# Altium footprint library aiskylab-01Resistors.PcbLib: 208 footprints (part 3 of 13)
Each footprint in its own frame and in the unit in brackets; x right, y up, seen from the top. Pads: shape width x height; smd on the part's side, far side on the other; paste and mask are expansions set on the pad; w line width, h text height; cw(c..) or ccw(c..) is an arc to the next point about the centre after c.
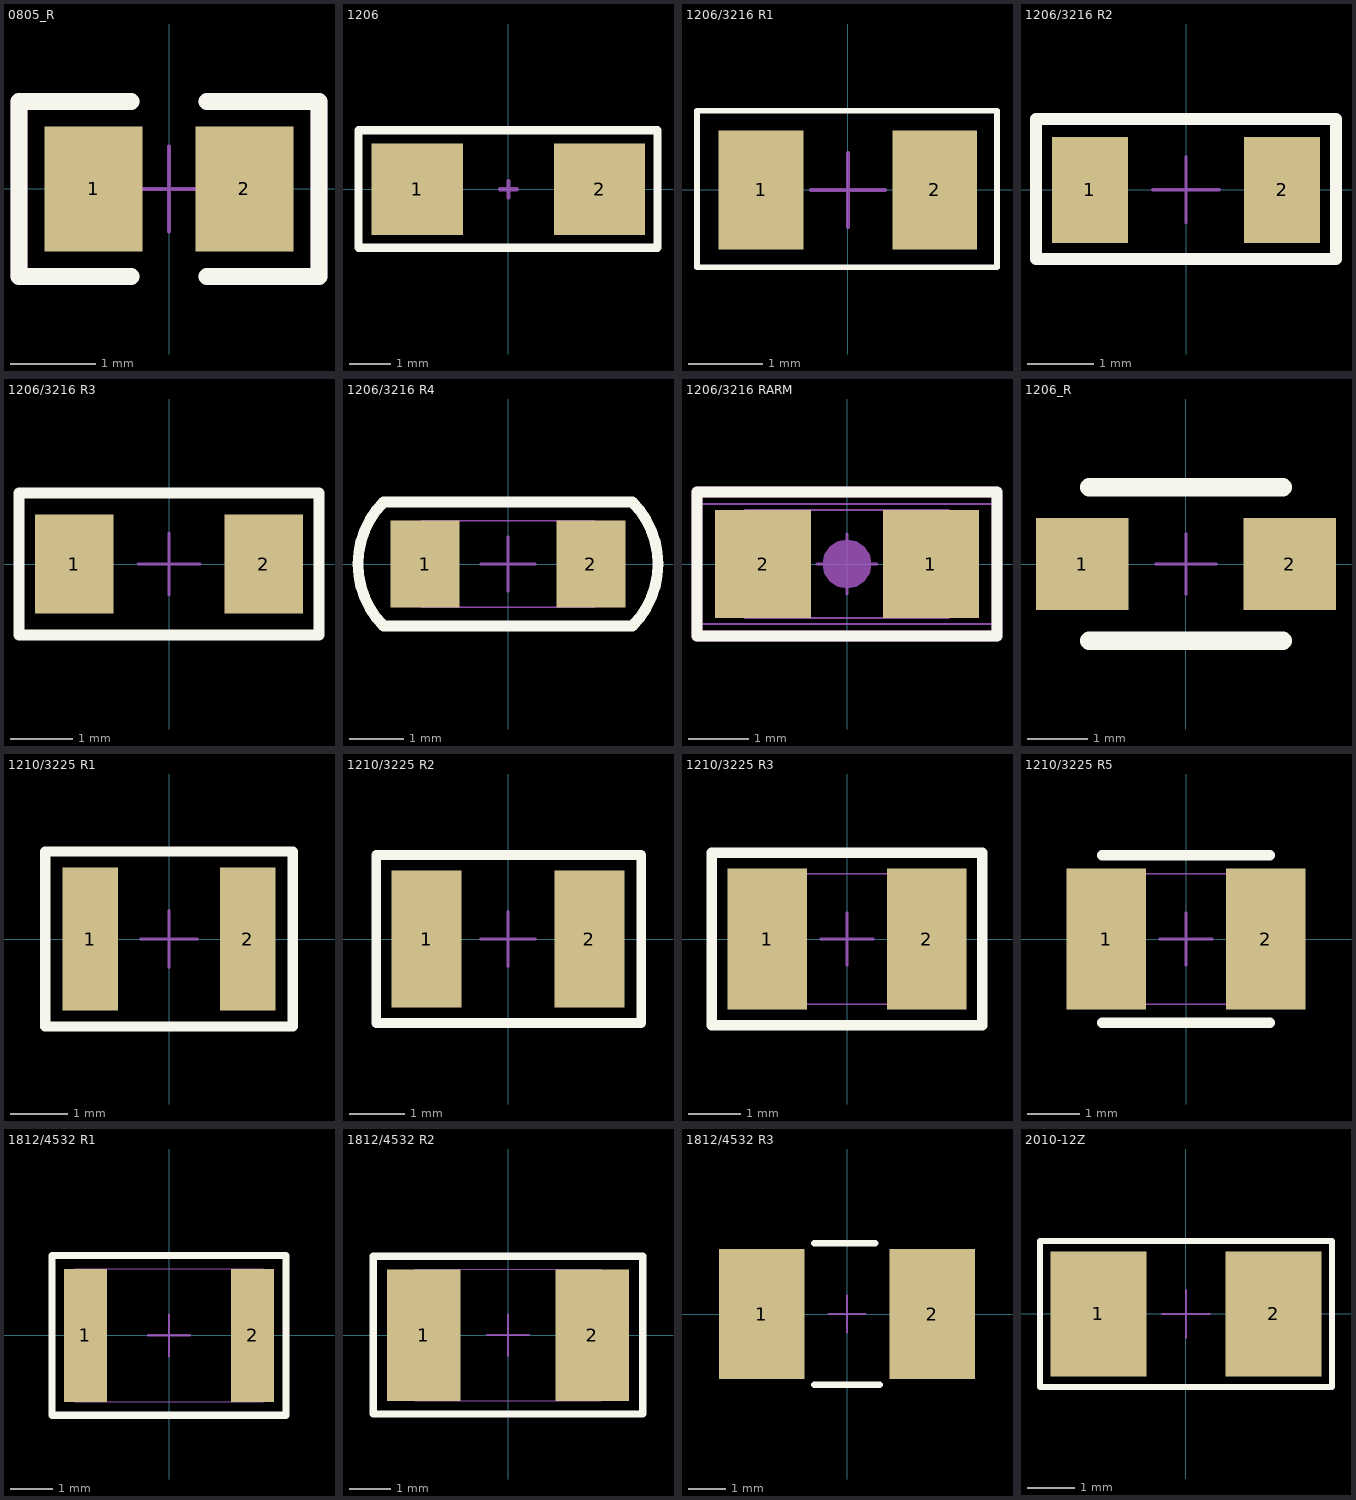
[diagram p2: the footprints below, top view; thin cyan lines are the x and y axes]

## 0805_R [mm]
pads (2):
  rect 1.16x1.47 smd: 1(-0.89,0) 2(0.89,0)
Top Overlay:
  lines w0.2: -0.45,-1.035 -1.77,-1.035 -1.77,1.035 -0.45,1.035 ; 0.45,-1.035 1.77,-1.035 1.77,1.035 0.45,1.035
Top Designator:
  text ".Designator" at -7.618,-0.508 h1.52
Top Assembly:
  lines w0.2: -0.45,-1.035 -1.77,-1.035 -1.77,1.035 -0.45,1.035 ; 0.45,-1.035 1.77,-1.035 1.77,1.035 0.45,1.035
Top Component Center:
  lines w0.05: -0.5,0 0.5,0 ; 0,-0.5 0,0.5
Top Component Outline:
  lines w0.2: -0.45,-1.035 -1.77,-1.035 -1.77,1.035 -0.45,1.035 ; 0.45,-1.035 1.77,-1.035 1.77,1.035 0.45,1.035
3D body "User Library-R_0805.STEP": height 0.49, standoff -0.01, extent -0.997,-0.625 1.003,0.625

## 1206 [mm] "1206,2-Leads, Body 6.5x2.2mm, Pitch 2.7mm"
height 4.3
pads (2):
  rect 2.2x2.2 smd: 1(-2.2,0) 2(2.2,0)
Top Overlay:
  lines w0.2: -3.62,-1.41 -3.62,1.42 3.6,1.42 3.6,-1.41 -3.62,-1.41
Top Designator:
  text ".Designator" at -7.628,-0.503 h1.52
Top Assembly:
  lines w0.1: -3.63,-1.41 -3.63,1.42 3.61,1.42 3.61,-1.41 -3.63,-1.41
Top Component Center:
  lines w0.1: -0.2,0 0.2,0 ; 0,-0.2 0,0.2
Top Component Outline:
  lines w0.1: -3.63,-1.41 -3.63,1.42 3.61,1.42 3.61,-1.41 -3.63,-1.41
3D body "WE-VS_1206_VS.stp": height 1.45, standoff -0.05, extent -1.6,-0.8 1.6,0.8

## 1206/3216 R1 [mil]
height 649.61
pads (2):
  rect 45x63 smd mask+2.76: 1(-46,0)
  rect 45x63 smd: 2(46,0)
Top Overlay:
  lines w3: -80,-41 -80,42 79,42 79,-41 -80,-41
Top Designator:
  text ".Designator" at -300.4,-19.49 h60
Top Component Center:
  lines w1.97: -19.68,0 19.68,0 ; 0,-19.68 0,19.68
3D body "1_6-1_143-1206.stp": height 0.79, standoff 0, extent -68.5,-31.49 -23.5,31.5
3D body "1206-r.stp": height 21.85, standoff 0, extent -63,-31.5 62.99,31.5
3D body "1_6-1_143-1206.stp": height 0.79, standoff 0, extent 23.5,-31.49 68.5,31.5

## 1206/3216 R2 [mil]
height 649.61
pads (2):
  rect 45x63 smd mask+2.76: 1(-57,0)
  rect 45x63 smd: 2(57,0)
Top Overlay:
  lines w7: -89,-41 89,-41 89,42 -89,42 -89,-41
Top Designator:
  text ".Designator" at -299.9,-19.49 h60
Top Component Center:
  lines w1.97: -19.68,0 19.68,0 ; 0,-19.68 0,19.68
3D body "1_6-1_143-1206.stp": height 0.79, standoff 0, extent 34.5,-31.49 79.5,31.5
3D body "1206-r.stp": height 21.85, standoff 0, extent -63,-31.5 62.99,31.5
3D body "1_6-1_143-1206.stp": height 0.79, standoff 0, extent -79.49,-31.49 -34.5,31.5

## 1206/3216 R3 [mil]
height 649.61
pads (2):
  rect 50x63 smd mask+2.76: 1(-60,0)
  rect 50x63 smd: 2(60,0)
Top Overlay:
  lines w7: -95,-45 -95,45 95,45 95,-45 -95,-45
Top Designator:
  text ".Designator" at -299.9,-19.99 h60
Top Component Center:
  lines w1.97: -19.68,0 19.68,0 ; 0,-19.68 0,19.68
3D body "1_6-1_27-1206a.stp": height 0.79, standoff 0, extent 35,-31.49 85,31.5
3D body "1_6-1_27-1206a.stp": height 0.79, standoff 0, extent -85,-31.49 -35,31.5
3D body "1206-r.stp": height 21.85, standoff 0, extent -63,-31.5 62.99,31.5

## 1206/3216 R4 [mil]
height 649.61
pads (2):
  rect 50x63 smd mask+2.76: 1(-60,0)
  rect 50x63 smd: 2(60,0)
Top Overlay:
  lines w7.87: -90,-45 cw(c-45,0) -90,45 90,45 cw(c45,0) 90,-45 -90,-45
Top Designator:
  text ".Designator" at -299.9,-19.99 h60
Top Component Center:
  lines w1.97: -19.68,0 19.68,0 ; 0,-19.68 0,19.68
Bottom 3D Body:
  lines w1: -63,-31.5 63,-31.5 63,31.5 -63,31.5 -63,-31.5
3D body "1_6-1_27-1206a.stp": height 0.79, standoff 0, extent 35,-31.49 85,31.5
3D body "1206-r.stp": height 21.85, standoff 0, extent -63,-32 62.99,31
3D body "1_6-1_27-1206a.stp": height 0.79, standoff 0, extent -85,-31.49 -35,31.5

## 1206/3216 RARM [mm]
height 16.5
pads (2):
  rect 1.6x1.8 smd: 1(1.4,0) 2(-1.4,0)
Top Overlay:
  lines w0.18: 2.472,-1.2 -2.5,-1.2 -2.5,1.2 2.5,1.2 2.5,-1.2
Top Designator:
  text ".Designator" at -7.618,-0.508 h1.52
Top Assembly:
  pour cut-out: 0,-0.408 -0.156,-0.377 -0.288,-0.288 -0.377,-0.156 -0.408,0 -0.377,0.156 -0.288,0.288 -0.156,0.377 0,0.408 0.156,0.377 0.288,0.288 0.377,0.156 0.408,0 0.377,-0.156 0.288,-0.288 0.156,-0.377
  lines w0.025: -2.5,-1 2.5,-1 2.5,1 -2.5,1 -2.5,-1 ; -1.7,-0.9 1.7,-0.9 1.7,0.9 -1.7,0.9 -1.7,-0.9
Top Component Center:
  lines w0.05: -0.5,0 0.5,0 ; 0,-0.5 0,0.5
Bottom Component Center:
  lines w0.18: 2.472,-1.2 -2.5,-1.2 -2.5,1.2 2.5,1.2 2.5,-1.2
Fab Notes:
  text "2" at -1.4,0.2 h0.5
  text "1" at 1.4,0.2 h0.5
3D body "1206-arm.stp": height 0, standoff 0, extent 0.6,-0.9 2.2,0.9
3D body "1206-r.stp": height 0.56, standoff 0, extent -1.6,-0.8 1.6,0.8
3D body "1206-arm.stp": height 0, standoff 0, extent -2.2,-0.9 -0.6,0.9

## 1206_R [mil]
height 649.61
pads (2):
  rect 60x60 smd: 1(-67.5,0)
  rect 60x60 smd mask+2.76: 2(67.5,0)
Top Overlay:
  lines w12: -62.99,-50 62.99,-50 ; -62.99,50 62.99,50
Top Designator:
  text ".Designator" at -300.52,-19.99 h60
Top Component Center:
  lines w1.97: -19.68,0 19.68,0 ; 0,-19.68 0,19.68
3D body "1_524-1_524.stp": height 0.79, standoff 0, extent 37.5,-29.99 97.5,30.01
3D body "1206-r.stp": height 21.85, standoff 0, extent -62.99,-31.49 63,31.5
3D body "1_524-1_524.stp": height 0.79, standoff 0, extent -97.49,-29.99 -37.49,30.01

## 1210/3225 R1 [mil]
height 649.61
pads (2):
  rect 38x98 smd mask+2.76: 1(-54,0)
  rect 38x98 smd: 2(54,0)
Top Overlay:
  lines w7: -85,-60 -85,60 85,60 85,-60 -85,-60
Top Designator:
  text ".Designator" at -299.9,-19.99 h60
Top Component Center:
  lines w1.97: -19.68,0 19.68,0 ; 0,-19.68 0,19.68
3D body "0_965-2_489-1210.stp": height 0.79, standoff 0, extent -73.49,-48.99 -35.5,49
3D body "1210-r.stp": height 22.05, standoff 0, extent -63,-49 62.99,49.43
3D body "0_965-2_489-1210.stp": height 0.79, standoff 0, extent 35.01,-48.99 73,49

## 1210/3225 R2 [mil]
height 649.61
pads (2):
  rect 50x98 smd mask+2.76: 1(-58,0)
  rect 50x98 smd: 2(58,0)
Top Overlay:
  lines w7: -94,-60 -94,60 95,60 95,-60 -94,-60
Top Designator:
  text ".Designator" at -299.4,-19.99 h60
Top Component Center:
  lines w1.97: -19.68,0 19.68,0 ; 0,-19.68 0,19.68
3D body "1_27-2_489-1210a.stp": height 0.79, standoff 0, extent 33,-48.99 83,49
3D body "1210-r.stp": height 22.05, standoff 0, extent -63,-49 62.99,49.43
3D body "1_27-2_489-1210a.stp": height 0.79, standoff 0, extent -83,-48.99 -33,49

## 1210/3225 R3 [mil]
height 649.61
pads (2):
  rect 60x106 smd mask+2.76: 1(-60,0)
  rect 60x106 smd: 2(60,0)
Top Overlay:
  lines w7.87: -102,-65 -102,65 102,65 102,-65 -102,-65
Top Designator:
  text ".Designator" at -299.9,-19.99 h60
Top Component Center:
  lines w1.97: -19.68,0 19.68,0 ; 0,-19.68 0,19.68
Bottom 3D Body:
  lines w1: -63,-49 63,-49 63,49 -63,49 -63,-49
3D body "1_524-2_692-1210c.stp": height 0.79, standoff 0, extent -90,-52.99 -30,53
3D body "1210-r.stp": height 22.05, standoff 0, extent -63,-49 62.99,49.43
3D body "1_524-2_692-1210c.stp": height 0.79, standoff 0, extent 30.01,-52.99 90.01,53

## 1210/3225 R5 [mil]
height 649.61
pads (2):
  rect 60x106 smd: 1(-60,0)
  rect 60x106 smd mask+2.76: 2(60,0)
Top Overlay:
  lines w7.87: -62.99,-62.99 62.99,-62.99 ; -62.99,62.99 62.99,62.99
Top Designator:
  text ".Designator" at -300.52,-19.99 h60
Top Component Center:
  lines w1.97: -19.68,0 19.68,0 ; 0,-19.68 0,19.68
Bottom 3D Body:
  lines w1: -63,-49 63,-49 63,49 -63,49 -63,-49
3D body "1_524-2_692-1210c.stp": height 0.79, standoff 0, extent 30,-52.99 90,53
3D body "1210-r.stp": height 22.05, standoff 0, extent -63,-49 62.99,49.43
3D body "1_524-2_692-1210c.stp": height 0.79, standoff 0, extent -90,-52.99 -30,53

## 1812/4532 R1 [mil]
height 649.61
pads (2):
  rect 40x125 smd: 1(-78.5,0)
  rect 40x125 smd mask+2.76: 2(78.5,0)
Top Overlay:
  lines w7: -110,-75 -110,75 110,75 110,-75 -110,-75
Top Designator:
  text ".Designator" at -299.9,-19.99 h60
Top Assembly:
  lines w1: -88.5,-62.5 -88.5,62.5 88.5,62.5 88.5,-62.5 -88.5,-62.5
Top Component Center:
  lines w1.97: -19.68,0 19.68,0 ; 0,-19.68 0,19.68
3D body "3_175-1_016-1812.stp": height 0.79, standoff 0, extent -99,-62.5 -59,62.5
3D body "1812_smt-r.stp": height 22.05, standoff 0, extent -88.58,-63 88.59,62.99
3D body "3_175-1_016-1812.stp": height 0.79, standoff 0, extent 59,-62.5 99,62.5

## 1812/4532 R2 [mil]
height 649.61
pads (2):
  rect 70x125 smd mask+2.76: 1(-80,0)
  rect 70x125 smd: 2(80,0)
Top Overlay:
  lines w7: -128,-75 128,-75 128,75 -128,75 -128,-75
Top Designator:
  text ".Designator" at -299.9,-19.99 h60
Top Assembly:
  lines w1: -88.5,-62.5 88.5,-62.5 88.5,62.5 -88.5,62.5 -88.5,-62.5
Top Component Center:
  lines w1.97: -19.68,0 19.68,0 ; 0,-19.68 0,19.68
3D body "3_175-1_778-1812.stp": height 0.79, standoff 0, extent 44.51,-62.5 114.5,62.5
3D body "1812_smt-r.stp": height 22.05, standoff 0, extent -88.58,-63 88.59,62.99
3D body "3_175-1_778-1812.stp": height 0.79, standoff 0, extent -114.5,-62.5 -44.5,62.5

## 1812/4532 R3 [mm] "PPTC"
height 16.5
pads (2):
  rect 2.3x3.5 smd mask+0.07: 1(-2.3,0)
  rect 2.3x3.5 smd: 2(2.3,0)
Top Overlay:
  lines w0.178: -0.889,-1.905 0.889,-1.905 ; -0.889,1.905 0.762,1.905
Top Designator:
  text ".Designator" at -7.602,-0.508 h1.52
Top Component Center:
  lines w0.05: -0.5,0 0.5,0 ; 0,-0.5 0,0.5
3D body "3_5-2_3-1812.stp": height 0.02, standoff 0, extent 1.149,-1.737 3.449,1.763
3D body "3_5-2_3-1812.stp": height 0.02, standoff 0, extent -3.461,-1.75 -1.161,1.75
3D body "1812_smt-r.stp": height 0.56, standoff 0, extent -2.25,-1.6 2.25,1.6

## 2010-12Z [mm]
height 16.5
pads (2):
  rect 2x2.6 smd: 1(-1.829,0) 2(1.829,0)
Top Overlay:
  lines w0.127: -3.048,-1.524 3.048,-1.524 3.048,1.524 -3.048,1.524 -3.048,-1.524
Top Designator:
  text ".Designator" at -7.618,-0.508 h1.52
Top Component Center:
  lines w0.05: -0.5,0 0.5,0 ; 0,-0.5 0,0.5
Bottom 3D Body:
  lines w0.01: -0.5,0 0.5,0 ; 0,-0.5 0,0.5
  lines w0.1: -3.048,-1.524 -3.048,1.524 3.048,1.524 3.048,-1.524 -3.048,-1.524
3D body "2_6-1_2.stp": height 0.01, standoff 0, extent -2.8,-1.3 -1.6,1.3
3D body "2010r.stp": height 0.69, standoff 0, extent -2.54,-1.27 2.54,1.27
3D body "2_6-1_2.stp": height 0.01, standoff 0, extent 1.6,-1.3 2.8,1.3